# Altium footprint library Derogarian_Library.PcbLib: 99 footprints (part 3 of 7)
Each footprint in its own frame and in the unit in brackets; x right, y up, seen from the top. Pads: shape width x height; smd on the part's side, far side on the other; paste and mask are expansions set on the pad; w line width, h text height; cw(c..) or ccw(c..) is an arc to the next point about the centre after c.
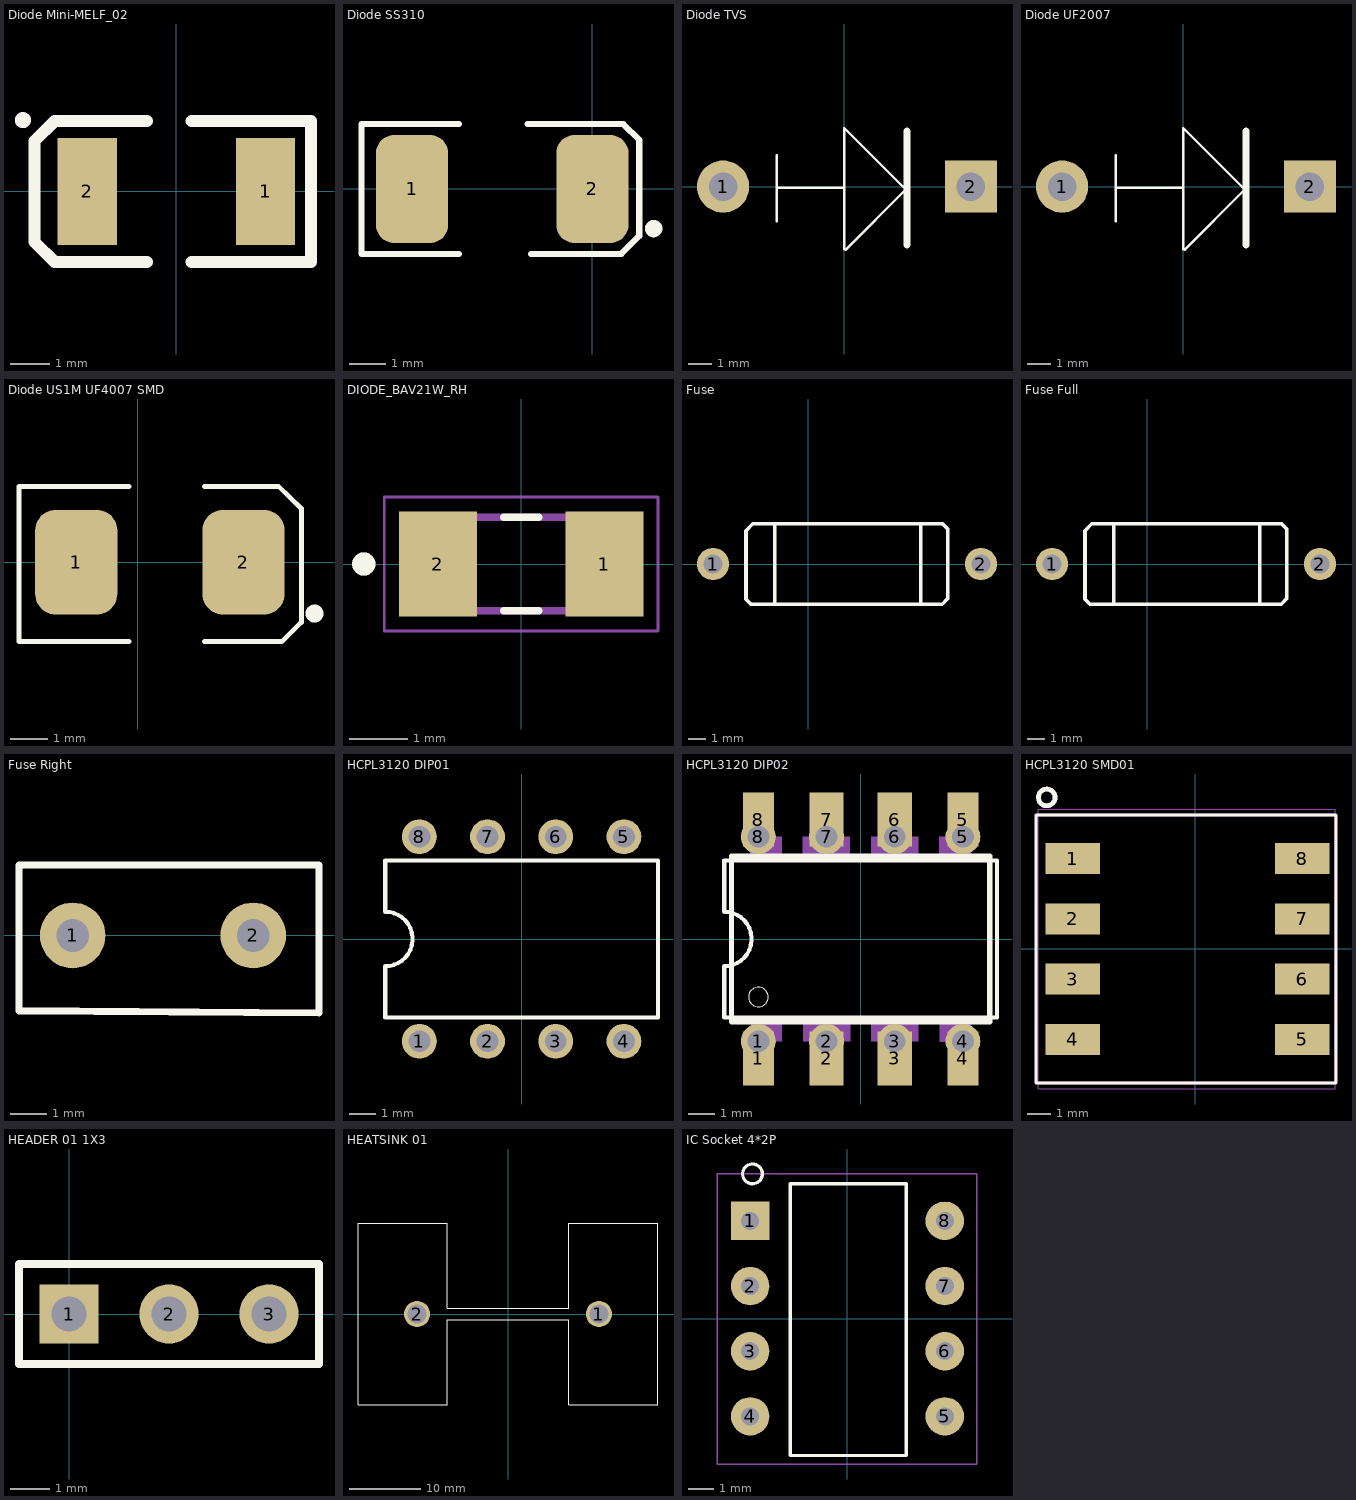
[diagram p2: the footprints below, top view; thin cyan lines are the x and y axes]

## Diode Mini-MELF_02 [mm] "Mini-MELF"
pads (2):
  rect 1.5x2.7 smd: 1(2.25,0) 2(-2.25,0)
Top Overlay:
  circle w0.2: c-3.879,1.803 r0.1
  lines w0.305: -3.592,1.2 -3.592,-1.27 -3.084,-1.778 -0.75,-1.778 ; -3.592,1.27 -3.084,1.778 -0.75,1.778 ; 0.381,-1.778 3.393,-1.778 3.393,1.778 0.381,1.778
Mechanical 13:
  circle w0.2: c-3.879,1.803 r0.1
3D body "User Library-MELF.STEP": height 3.25, standoff 0.75, extent -2.437,-1.25 2.563,1.25

## Diode SS310 [mm]
pads (2):
  rrect50% 2x3 smd: 1(-5,0) 2(0,0)
Top Overlay:
  circle w0.24: c1.7,-1.1 r0.12
  lines w0.17: -3.7,-1.8 -6.4,-1.8 -6.4,1.8 -3.7,1.8 ; -1.8,1.8 0.625,1.8 0.863,1.8 1.3,1.363 1.3,-1.1 ; -1.7,-1.8 0.8,-1.8 1.3,-1.3 1.3,-1
3D body "User Library-403A-03_rotated.STEP": height 2.36, standoff 0.05, extent -5.42,-1.68 0.02,1.88

## Diode TVS [mm] "Through Hole Diode"
height 2.8
pads (2):
  round 2.2 hole 1.2: 1(-5.105,0)
  rect 2.2x2.2 hole 1.2: 2(5.334,0)
Top Overlay:
  lines w0.1: -2.845,-1.473 -2.845,1.321 ; -2.845,-0.051 0,-0.051 ; 0,-2.642 0,2.464 2.591,-0.127 0.051,-2.667
  lines w0.3: 2.642,-2.464 2.642,2.337
3D body "CircuitWorks-DIODE0_4.STEP": height 3.55, standoff -1.54, extent -5.334,-1.397 5.588,1.168

## Diode UF2007 [mm] "Through Hole Diode"
height 2.8
pads (2):
  round 2.2 hole 1.2: 1(-5.105,0)
  rect 2.2x2.2 hole 1.2: 2(5.334,0)
Top Overlay:
  lines w0.1: -2.845,-1.473 -2.845,1.321 ; -2.845,-0.051 0,-0.051 ; 0,-2.642 0,2.464 2.591,-0.127 0.051,-2.667
  lines w0.3: 2.642,-2.464 2.642,2.337
3D body "CircuitWorks-DIODE0_4.STEP": height 3.55, standoff -1.54, extent -5.334,-1.397 5.588,1.168

## Diode US1M UF4007 SMD [mm]
pads (2):
  rrect50% 2.2x2.8 smd: 1(-1.645,0) 2(2.825,0)
Top Overlay:
  circle w0.24: c4.725,-1.375 r0.12
  lines w0.127: -0.225,-2.125 -3.175,-2.125 -3.175,2.025 -0.225,2.025 ; 1.775,-2.125 3.845,-2.125 4.375,-1.613 4.375,1.434 3.763,2.025 1.775,2.025
3D body "User Library-403A-03_rotated.STEP": height 2.31, standoff 0, extent -2.095,-1.935 3.345,1.625

## DIODE_BAV21W_RH [mm]
pads (2):
  rect 1.34x1.8 smd: 1(1.43,0) 2(-1.43,0)
Top Overlay:
  circle w0.2: c-2.7,0 r0.1
  lines w0.127: -0.3,-0.8 0.3,-0.8 ; -0.3,0.8 0.3,0.8
Mechanical 13:
  circle w0.2: c-2.7,0 r0.1
  lines w0.127: -1.3,-0.8 1.3,-0.8 1.3,0.8 -1.3,0.8 -1.3,-0.8
Mechanical 15:
  lines w0.05: -2.35,-1.15 2.35,-1.15 2.35,1.15 -2.35,1.15 -2.35,-1.15
3D body "step_temp.STEP": height 1.15, standoff 0, extent -1.8,-0.8 1.8,0.8

## Fuse [mm] "Through Hole Fuse"
pads (2):
  round 1.8 hole 1.05: 1(-5.334,0) 2(9.65,0)
Top Overlay:
  lines w0.2: -2.17,-2.25 -3.211,-2.25 -3.494,-1.967 -3.494,-0.152 -3.494,1.865 -3.109,2.25 -2.159,2.25 6.488,2.25 7.504,2.25 7.783,1.97 7.783,0.051 7.783,-1.945 7.478,-2.25 6.477,-2.25 -2.159,-2.25 ; -1.891,-2.25 -1.891,0 -1.891,2.25 ; 6.285,-2.25 6.285,0 6.285,2.25
3D body "User Library-T5A-250V.STEP": height 3.35, standoff -2.41, extent -5.641,-1.651 9.959,1.649

## Fuse Full [mm] "Through Hole Fuse"
pads (2):
  round 1.8 hole 1.05: 1(-5.334,0) 2(9.65,0)
Top Overlay:
  lines w0.2: -2.17,-2.25 -3.211,-2.25 -3.494,-1.967 -3.494,-0.152 -3.494,1.865 -3.109,2.25 -2.159,2.25 6.488,2.25 7.504,2.25 7.783,1.97 7.783,0.051 7.783,-1.945 7.478,-2.25 6.477,-2.25 -2.159,-2.25 ; -1.891,-2.25 -1.891,0 -1.891,2.25 ; 6.285,-2.25 6.285,0 6.285,2.25
3D body "User Library-Full Fuse 5x20.STEP": height 9.5, standoff -3.95, extent -7.053,-2.87 13.047,3.039

## Fuse Right [mm] "Through Hole Righ Fuse"
pads (2):
  round 1.8 hole 0.9: 1(3.277,0) 2(8.23,0)
Top Overlay:
  lines w0.2: 1.803,-2.066 1.803,1.93 10.033,1.93 10.033,-2.126 1.803,-2.066
3D body "User Library-Fuse 3_6x10.STEP": height 13.7, standoff -2, extent 2.954,-2.122 10.254,1.778

## HCPL3120 DIP01 [mm]
pads (8):
  round 1.3 hole 0.813: 1(-3.81,-3.81) 2(-1.27,-3.81) 3(1.27,-3.81) 4(3.81,-3.81) 5(3.81,3.81) 6(1.27,3.81) 7(-1.27,3.81) 8(-3.81,3.81)
Top Overlay:
  lines w0.152: -5.08,-2.921 -5.08,-1.016 ccw(c-5.08,0) -5.08,1.016 -5.08,2.921 5.08,2.921 5.08,-2.921 -5.08,-2.921
3D body "HCPL-3120#060.STEP": height 4.96, standoff -2.95, extent -4.86,-3.81 4.91,3.81

## HCPL3120 DIP02 [mm]
pads (16):
  rect 1.16x2 smd: 1(-3.81,-4.45) 4(3.81,-4.45) 5(3.81,4.45) 8(-3.81,4.45)
  round 1.3 hole 0.813: 1(-3.81,-3.81) 2(-1.27,-3.81) 3(1.27,-3.81) 4(3.81,-3.81) 5(3.81,3.81) 6(1.27,3.81) 7(-1.27,3.81) 8(-3.81,3.81)
  rect 1.27x2 smd: 2(-1.27,-4.45) 3(1.27,-4.45) 6(1.27,4.45) 7(-1.27,4.45)
Top Overlay:
  circle w0: c-3.81,-2.159 r0.367
  lines w0.152: -5.08,-2.921 5.08,-2.921 5.08,2.921 -5.08,2.921 -5.08,1.016 cw(c-5.08,0) -5.08,-1.016 -5.08,-2.921
  lines w0.203: -4.81,-3.075 4.81,-3.075 4.81,3.075 -4.81,3.075 -4.81,-3.075
Mechanical 13:
  region: 4.1,-3.819 2.947,-3.819 2.947,-3.1 4.1,-3.1
  region: 2.15,-3.815 0.401,-3.815 0.401,-3.1 2.15,-3.1
  region: -0.39,-3.818 -2.145,-3.818 -2.145,-3.1 -0.39,-3.1
  region: -2.93,-3.818 -4.083,-3.818 -4.083,-3.1 -2.93,-3.1
  region: 4.1,3.104 2.934,3.104 2.934,3.81 4.1,3.81
  region: 2.14,3.106 0.391,3.106 0.391,3.81 2.14,3.81
  region: -2.94,3.106 -4.108,3.106 -4.108,3.81 -2.94,3.81
  region: -0.4,3.105 -2.154,3.105 -2.154,3.81 -0.4,3.81
  region: -3.53,3.818 -4.098,3.818 -4.098,4.825 -3.53,4.825
  region: -0.99,3.816 -1.552,3.816 -1.552,4.825 -0.99,4.825
  region: 1.55,3.823 0.993,3.823 0.993,4.825 1.55,4.825
  region: 4.09,3.818 3.537,3.818 3.537,4.825 4.09,4.825
  region: 4.09,-4.84 3.541,-4.84 3.541,-3.81 4.09,-3.81
  region: 1.55,-4.826 0.99,-4.826 0.99,-3.81 1.55,-3.81
  region: -0.99,-4.829 -1.551,-4.829 -1.551,-3.81 -0.99,-3.81
  region: -3.53,-4.835 -4.099,-4.835 -4.099,-3.81 -3.53,-3.81
3D body "HCPL3120.STEP": height 4.45, standoff 0, extent -4.876,-4.85 4.774,4.8

## HCPL3120 SMD01 [mm]
pads (8):
  rect 2.29x1.3 smd: 1(-5.156,3.81) 2(-5.156,1.27) 3(-5.156,-1.27) 4(-5.156,-3.81) 5(4.521,-3.81) 6(4.521,-1.27) 7(4.521,1.27) 8(4.521,3.81)
Top Overlay:
  circle w0.2: c-6.252,6.389 r0.352
  lines w0.127: -6.706,5.639 -6.706,3.519 -6.706,-5.65 5.944,-5.65 5.944,5.65 -4.575,5.65 -6.173,5.65 -6.694,5.65
Mechanical 13:
  circle w0.2: c-6.252,6.389 r0.352
  lines w0.127: -6.68,-5.65 5.918,-5.65 5.918,5.65 -6.68,5.65 -6.68,-5.65
Mechanical 15:
  lines w0.05: -6.604,-5.9 5.918,-5.9 5.918,5.9 -6.604,5.9 -6.604,-5.9
3D body "HCPL3120.STEP": height 4.45, standoff 0, extent -4.901,-4.749 4.749,4.901

## HEADER 01 1X3 [mm] "Connector; Header; 3 Position"
pads (3):
  rect 1.5x1.5 hole 0.9: 1(0,0)
  round 1.5 hole 0.9: 2(2.54,0) 3(5.08,0)
Top Overlay:
  lines w0.2: -1.27,-1.27 6.35,-1.27 6.35,1.27 -1.27,1.27 -1.27,-1.27
3D body "User Library-SMW250-03.STEP": height 7, standoff -3.5, extent -2.37,-3.489 7.53,2.9

## HEATSINK 01 [mil]
pads (2):
  round 143 hole 103: 1(500,0) 2(-500,0)
Top Overlay:
  lines w5: -825,-500 -825,500 -335,500 -335,31 335,31 335,500 825,500 825,-500 335,-500 335,-31 -335,-31 -335,-500 -825,-500
3D body "step_temp.STEP": height 2500, standoff -155.91, extent -825,-500 825,500

## Hole 01 [mm]

## IC Socket 4*2P [mm] "IC OFFLINE SWITCH FLYBACK 8DIP"
pads (8):
  rect 1.5x1.5 hole 0.7: 1(-3.793,3.81)
  round 1.5 hole 0.7: 2(-3.793,1.27) 3(-3.793,-1.27) 4(-3.793,-3.81) 5(3.793,-3.81) 6(3.793,-1.27) 7(3.793,1.27) 8(3.793,3.81)
Top Overlay:
  circle w0.127: c-3.7,5.639 r0.386
  lines w0.127: 2.269,-5.334 -2.227,-5.334 -2.227,5.258 2.294,5.258 2.294,-5.334
Mechanical 15:
  lines w0.05: -2.674,5.623 -2.659,5.639 ; -5.072,-5.664 5.037,-5.664 5.037,5.639 -5.072,5.639 -5.072,-5.664
3D body "a_08-lc-tt.stp": height 6, standoff -2.25, extent -5.004,-5.105 5.156,5.055